# Altium footprint library pcblib.PcbLib: 92 footprints (part 4 of 6)
Each footprint in its own frame and in the unit in brackets; x right, y up, seen from the top. Pads: shape width x height; smd on the part's side, far side on the other; paste and mask are expansions set on the pad; w line width, h text height; cw(c..) or ccw(c..) is an arc to the next point about the centre after c.
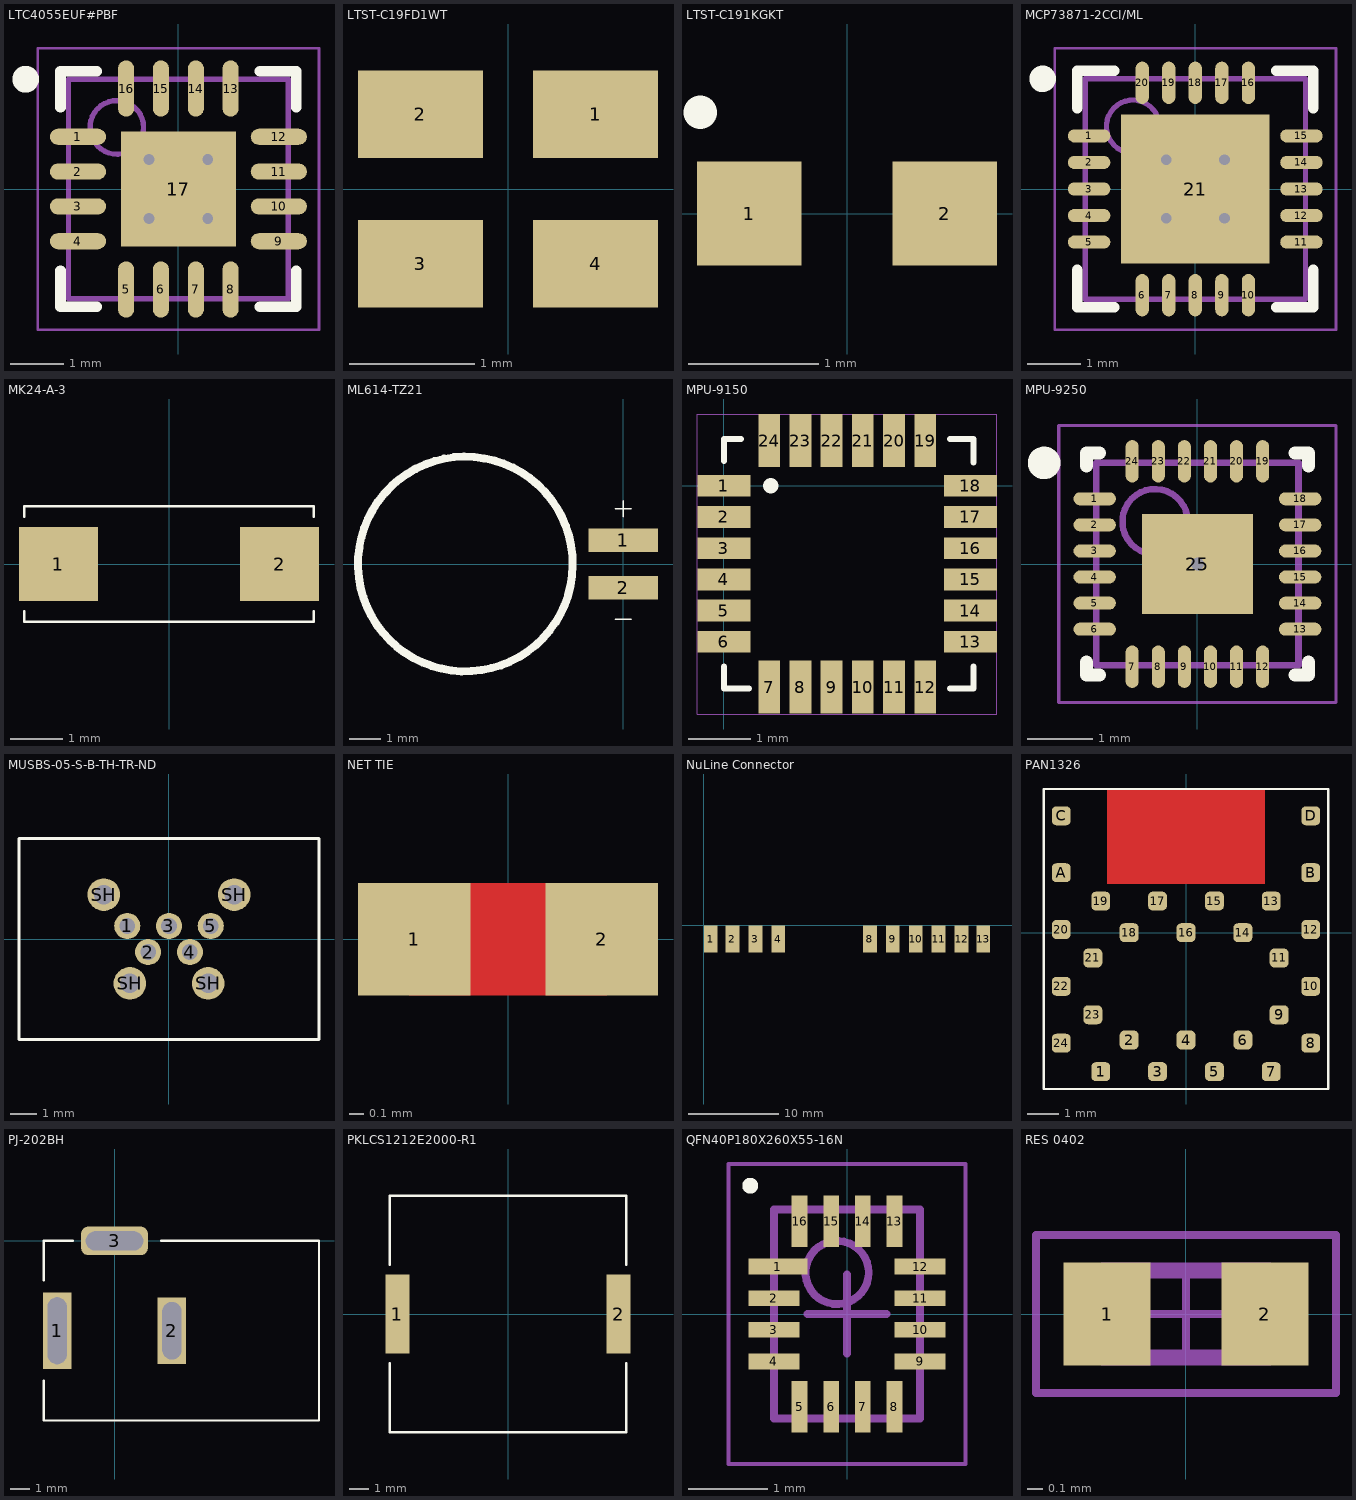
[diagram p3: the footprints below, top view; thin cyan lines are the x and y axes]

## LTC4055EUF#PBF [mm] "QFN, 16-Leads, Body 4.1x4.1mm, Pitch 0.65mm, Thermal Pad 2.15x2.15mm, IPC Medium Density"
height 0.8
pads (17):
  oval 1.05x0.3 smd: 1(-1.875,0.975) 2(-1.875,0.325) 3(-1.875,-0.325) 4(-1.875,-0.975) 9(1.875,-0.975) 10(1.875,-0.325) 11(1.875,0.325) 12(1.875,0.975)
  oval 0.3x1.05 smd: 5(-0.975,-1.875) 6(-0.325,-1.875) 7(0.325,-1.875) 8(0.975,-1.875) 13(0.975,1.875) 14(0.325,1.875) 15(-0.325,1.875) 16(-0.975,1.875)
  rect 2.15x2.15 smd: 17(0,0)
via -0.55,0.55 diameter 0.5 hole 0.2
via 0.55,0.55 diameter 0.5 hole 0.2
via -0.55,-0.55 diameter 0.5 hole 0.2
via 0.55,-0.55 diameter 0.5 hole 0.2
Top Overlay:
  circle w0.25: c-2.85,2.05 r0.125
  lines w0.2: -2.2,-1.525 -2.2,-2.2 -1.525,-2.2 ; -2.2,1.525 -2.2,2.2 -1.525,2.2 ; 1.525,-2.2 2.2,-2.2 2.2,-1.525 ; 1.525,2.2 2.2,2.2 2.2,1.525
Mechanical 13:
  circle w0.1: c-1.15,1.15 r0.5
  lines w0.1: -2.05,-2.05 -2.05,2.05 2.05,2.05 2.05,-2.05 -2.05,-2.05
Mechanical 15:
  lines w0.05: -2.625,-2.625 -2.625,2.625 2.625,2.625 2.625,-2.625 -2.625,-2.625
  lines w0.1: -0.5,0 0.5,0 ; 0,-0.5 0,0.5
3D body: height 0.8, standoff 0, extent -2.05,-2.05 2.05,2.05

## LTST-C19FD1WT [mm] "LED RGB 605/525/470NM DIFF SMD"
height 0.55
pads (4):
  rect 1x0.7 smd: 1(0.7,0.6) 2(-0.7,0.6) 3(-0.7,-0.6) 4(0.7,-0.6)
3D body: height 0.55, standoff 0.18, extent -1.05,-0.8 1.05,0.8

## LTST-C191KGKT [mm] "LED GREEN CLEAR THIN 0603 SMD"
pads (2):
  rect 0.8x0.8 smd: 1(-0.75,0) 2(0.75,0)
Top Overlay:
  lines w0.254: -1.125,0.775 -1.125,0.776
3D body: height 0.55, standoff 0, extent -0.8,-0.4 0.8,0.4

## MCP73871-2CCI/ML [mm] "QFN, 20-Leads, Body 4x4mm, Pitch 0.5mm, Thermal Pad 2.8x2.8mm, IPC Medium Density"
height 1
pads (21):
  oval 0.8x0.25 smd: 1(-2,1) 2(-2,0.5) 3(-2,0) 4(-2,-0.5) 5(-2,-1) 11(2,-1) 12(2,-0.5) 13(2,0) 14(2,0.5) 15(2,1)
  oval 0.25x0.8 smd: 6(-1,-2) 7(-0.5,-2) 8(0,-2) 9(0.5,-2) 10(1,-2) 16(1,2) 17(0.5,2) 18(0,2) 19(-0.5,2) 20(-1,2)
  rect 2.8x2.8 smd: 21(0,0)
via -0.55,0.55 diameter 0.5 hole 0.2
via 0.55,0.55 diameter 0.5 hole 0.2
via -0.55,-0.55 diameter 0.5 hole 0.2
via 0.55,-0.55 diameter 0.5 hole 0.2
Top Overlay:
  circle w0.25: c-2.875,2.075 r0.125
  lines w0.2: -2.225,-1.525 -2.225,-2.225 -1.525,-2.225 ; -2.225,1.525 -2.225,2.225 -1.525,2.225 ; 1.525,-2.225 2.225,-2.225 2.225,-1.525 ; 1.525,2.225 2.225,2.225 2.225,1.525
Mechanical 13:
  circle w0.1: c-1.175,1.175 r0.5
  lines w0.1: -2.075,-2.075 -2.075,2.075 2.075,2.075 2.075,-2.075 -2.075,-2.075
Mechanical 15:
  lines w0.05: -2.65,-2.65 -2.65,2.65 2.65,2.65 2.65,-2.65 -2.65,-2.65
  lines w0.1: -0.5,0 0.5,0 ; 0,-0.5 0,0.5
3D body: height 1, standoff 0, extent -2.075,-2.075 2.075,2.075

## MK24-A-3 [mm] "REED SENSOR 23-50AT J-LEAD"
pads (2):
  rect 1.5x1.4 smd: 1(-2.1,0) 2(2.1,0)
Top Overlay:
  lines w0.051: -2.75,-0.9 -2.75,-1.1 2.75,-1.1 2.75,-0.9 ; -2.75,0.9 -2.75,1.1 2.75,1.1 2.75,0.9
3D body: height 1.8, standoff 0.1, extent -2.75,-1.1 2.75,1.1

## ML614-TZ21 [mm] "BATT LITH 3V RECHARGE W/TABS"
pads (2):
  rect 2.2x0.75 smd: 1(0,0.75) 2(0,-0.75)
Top Overlay:
  lines w0.051: -0.25,-1.75 0.25,-1.75 ; -0.25,1.75 0.25,1.75 ; 0,1.5 0,2
  lines w0.254: -1.949,1.5 ccw(c-5,0) -1.944,1.49
3D body: height 1.8, standoff 0, extent -8.373,-3.393 -1.6,3.393

## MPU-9150 [mm]
pads (24):
  rect 0.85x0.35 smd: 1(0,0) 2(0,-0.5) 3(0,-1) 4(0,-1.5) 5(0,-2) 6(0,-2.5) 13(3.95,-2.5) 14(3.95,-2) 15(3.95,-1.5) 16(3.95,-1) 17(3.95,-0.5) 18(3.95,0)
  rect 0.35x0.85 smd: 7(0.725,-3.225) 8(1.225,-3.225) 9(1.725,-3.225) 10(2.225,-3.225) 11(2.725,-3.225) 12(3.225,-3.225) 19(3.225,0.725) 20(2.725,0.725) 21(2.225,0.725) 22(1.725,0.725) 23(1.225,0.725) 24(0.725,0.725)
Top Overlay:
  lines w0.1: 0,-2.9 0,-3.25 0.4,-3.25 ; 0,0.4 0,0.75 0.275,0.75 ; 3.625,-3.25 4,-3.25 4,-2.9 ; 3.625,0.75 4,0.75 4,0.375
  lines w0.254: 0.75,0 0.75,0
Mechanical 1:
  lines w0.01: -0.432,-3.657 4.368,-3.657 4.368,1.143 -0.432,1.143 -0.432,-3.657
3D body: height 1, standoff 0, extent 0,-3.25 4,0.75

## MPU-9250 [mm] "QFN, 24-Leads, Body 3.00x3.00mm, Pitch 0.40mm, Thermal Pad 1.70x1.54mm, IPC Medium Density"
height 1.05
pads (25):
  oval 0.65x0.2 smd: 1(-1.575,1) 2(-1.575,0.6) 3(-1.575,0.2) 4(-1.575,-0.2) 5(-1.575,-0.6) 6(-1.575,-1) 13(1.575,-1) 14(1.575,-0.6) 15(1.575,-0.2) 16(1.575,0.2) 17(1.575,0.6) 18(1.575,1)
  oval 0.2x0.65 smd: 7(-1,-1.575) 8(-0.6,-1.575) 9(-0.2,-1.575) 10(0.2,-1.575) 11(0.6,-1.575) 12(1,-1.575) 19(1,1.575) 20(0.6,1.575) 21(0.2,1.575) 22(-0.2,1.575) 23(-0.6,1.575) 24(-1,1.575)
  rect 1.7x1.54 smd: 25(0,0)
via 0,0 diameter 0.5 hole 0.2
Top Overlay:
  circle w0.25: c-2.35,1.55 r0.125
  lines w0.2: -1.7,-1.5 -1.7,-1.7 -1.5,-1.7 ; -1.7,1.5 -1.7,1.7 -1.5,1.7 ; 1.5,-1.7 1.7,-1.7 1.7,-1.5 ; 1.5,1.7 1.7,1.7 1.7,1.5
Mechanical 13:
  circle w0.1: c-0.65,0.65 r0.5
  lines w0.1: -1.55,-1.55 1.55,-1.55 1.55,1.55 -1.55,1.55 -1.55,-1.55
Mechanical 15:
  lines w0.05: -2.125,-2.125 2.125,-2.125 2.125,2.125 -2.125,2.125 -2.125,-2.125
  lines w0.1: -0.5,0 0.5,0 ; 0,-0.5 0,0.5
3D body: height 1.05, standoff 0.05, extent -1.55,-1.55 1.55,1.55

## MUSBS-05-S-B-TH-TR-ND [mm] "CONN RECEPT USB MINI B VERT"
height 10.54
pads (9):
  round 1 hole 0.6: 1(-1.6,0.5) 2(-0.8,-0.5) 3(0,0.5) 4(0.8,-0.5) 5(1.6,0.5)
  round 1.25 hole 0.75: SH(-2.5,1.7) SH(-1.5,-1.7) SH(1.5,-1.7) SH(2.5,1.7)
Top Overlay:
  lines w0.127: -5.75,-3.85 -5.75,3.85 5.75,3.85 5.75,-3.85 -5.75,-3.85
3D body: height 9.27, standoff -4.06, extent -5.75,-3.875 5.75,3.825

## NET TIE [mil] "30mils to 30mils"
pads (2):
  rect 30x30 smd paste-30 mask-30: 1(-25,0) 2(25,0)
Top Layer:
  lines w30: -25,0 25,0

## NuLine Connector [mil] "Pads for NuLine Proprietary connector"
pads (10):
  rect 60x120 smd: 1(30,-60) 2(125,-60) 3(225,-60) 4(325,-60) 8(725,-60) 9(825,-60) 10(925,-60) 11(1025,-60) 12(1125,-60) 13(1220,-60)

## PAN1326 [mm] "MOD BT + BLE HCI W/ANTENNA"
pads (28):
  rrect50% 0.6x0.6 smd: 1(-2.7,-4.4)
  rrect50% 0.6x0.6 smd mask+0.102: 2(-1.8,-3.4) 3(-0.9,-4.4) 4(0,-3.4) 5(0.9,-4.4) 6(1.8,-3.4) 7(2.7,-4.4) 8(3.95,-3.5) 9(2.95,-2.6) 10(3.95,-1.7) 11(2.95,-0.8) 12(3.95,0.1) 13(2.7,1) 14(1.8,0) 15(0.9,1) 16(0,0) 17(-0.9,1) 18(-1.8,0) 19(-2.7,1) 20(-3.95,0.1) 21(-2.95,-0.8) 22(-3.95,-1.7) 23(-2.95,-2.6) 24(-3.95,-3.5) A(-3.95,1.9) B(3.95,1.9) C(-3.95,3.7) D(3.95,3.7)
Top Layer:
  pour cut-out: -2.5,4.55 -2.5,1.55 2.5,1.55 2.5,4.55
Bottom Layer:
  pour cut-out: -2.5,4.55 -2.5,1.55 2.5,1.55 2.5,4.55
Top Overlay:
  lines w0.076: -4.5,-4.95 4.5,-4.95 4.5,4.55 -4.5,4.55 -4.5,-4.95
3D body: height 1.73, standoff 0, extent -4.5,-4.95 4.5,4.55

## PJ-202BH [mm] "CONN PWR JACK 2.5X5.5MM HIGH CUR"
pads (3):
  rect 1.5x4 hole 1 slot 3.5 at 90 deg: 1(-3,-4.7)
  rect 1.5x3.5 hole 1 slot 3 at 90 deg: 2(3,-4.7)
  rrect50% 3.5x1.5 hole 1 slot 3 at 0 deg: 3(0,0)
Top Overlay:
  lines w0.127: -3.7,-7.307 -3.7,-9.4 ; -3.7,-2.049 -3.7,0 -2.184,0 ; 2.438,0 10.7,0 10.7,-9.4 -3.7,-9.4 ; -3.7,-9.4 -3.7,-9.4
3D body: height 11, standoff -3.5, extent -3.7,-9.297 10.7,0.103

## PKLCS1212E2000-R1 [mm] "BUZZER PIEZO 25VP-P SMD"
height 3
pads (2):
  rect 1.2x4 smd: 1(-5.6,0) 2(5.6,0)
Top Overlay:
  lines w0.127: -6,-2.5 -6,-6 6,-6 6,-2.5 ; -6,2.5 -6,6 6,6 6,2.5
3D body: height 3, standoff 0, extent -6,-6 6,6

## QFN40P180X260X55-16N [mm] "QFN, 16-Leads, Body 1.80x2.60mm, Pitch 0.40mm, IPC Medium Density"
height 0.55
pads (16):
  rect 0.75x0.2 smd mask+0.05: 1(-0.875,0.6)
  rect 0.65x0.2 smd mask+0.05: 2(-0.925,0.2) 3(-0.925,-0.2) 4(-0.925,-0.6) 9(0.925,-0.6) 10(0.925,-0.2) 11(0.925,0.2) 12(0.925,0.6)
  rect 0.2x0.65 smd mask+0.05: 5(-0.6,-1.175) 6(-0.2,-1.175) 7(0.2,-1.175) 8(0.6,-1.175) 13(0.6,1.175) 14(0.2,1.175) 15(-0.2,1.175) 16(-0.6,1.175)
Top Overlay:
  circle w0.1: c-1.225,1.625 r0.05
Mechanical 13:
  circle w0.1: c-0.125,0.525 r0.4
  lines w0.1: -0.925,-1.325 0.925,-1.325 0.925,1.325 -0.925,1.325 -0.925,-1.325
Mechanical 15:
  lines w0.05: -1.5,-1.9 1.5,-1.9 1.5,1.9 -1.5,1.9 -1.5,-1.9
  lines w0.1: -0.5,0 0.5,0 ; 0,-0.5 0,0.5
3D body: height 0.55, standoff 0.05, extent -0.925,-1.325 0.925,1.325

## RES 0402 [mm] "Chip Resistor, Body 1.0x0.5mm, IPC Medium Density"
height 0.4
pads (2):
  rect 0.55x0.65 smd: 1(-0.5,0) 2(0.5,0)
Mechanical 13:
  lines w0.1: -0.525,-0.275 0.525,-0.275 0.525,0.275 -0.525,0.275 -0.525,-0.275
Mechanical 15:
  lines w0.05: -0.275,0 0.275,0 ; 0,-0.275 0,0.275 ; -0.95,-0.5 0.95,-0.5 0.95,0.5 -0.95,0.5 -0.95,-0.5
3D body: height 0.4, standoff 0, extent -0.525,-0.275 -0.3,0.275
3D body: height 0.4, standoff 0, extent -0.3,-0.275 0.3,0.275
3D body: height 0.4, standoff 0, extent 0.3,-0.275 0.525,0.275